# Altium footprint library StandardCase.PcbLib: 200 footprints (part 11 of 13)
Each footprint in its own frame and in the unit in brackets; x right, y up, seen from the top. Pads: shape width x height; smd on the part's side, far side on the other; paste and mask are expansions set on the pad; w line width, h text height; cw(c..) or ccw(c..) is an arc to the next point about the centre after c.
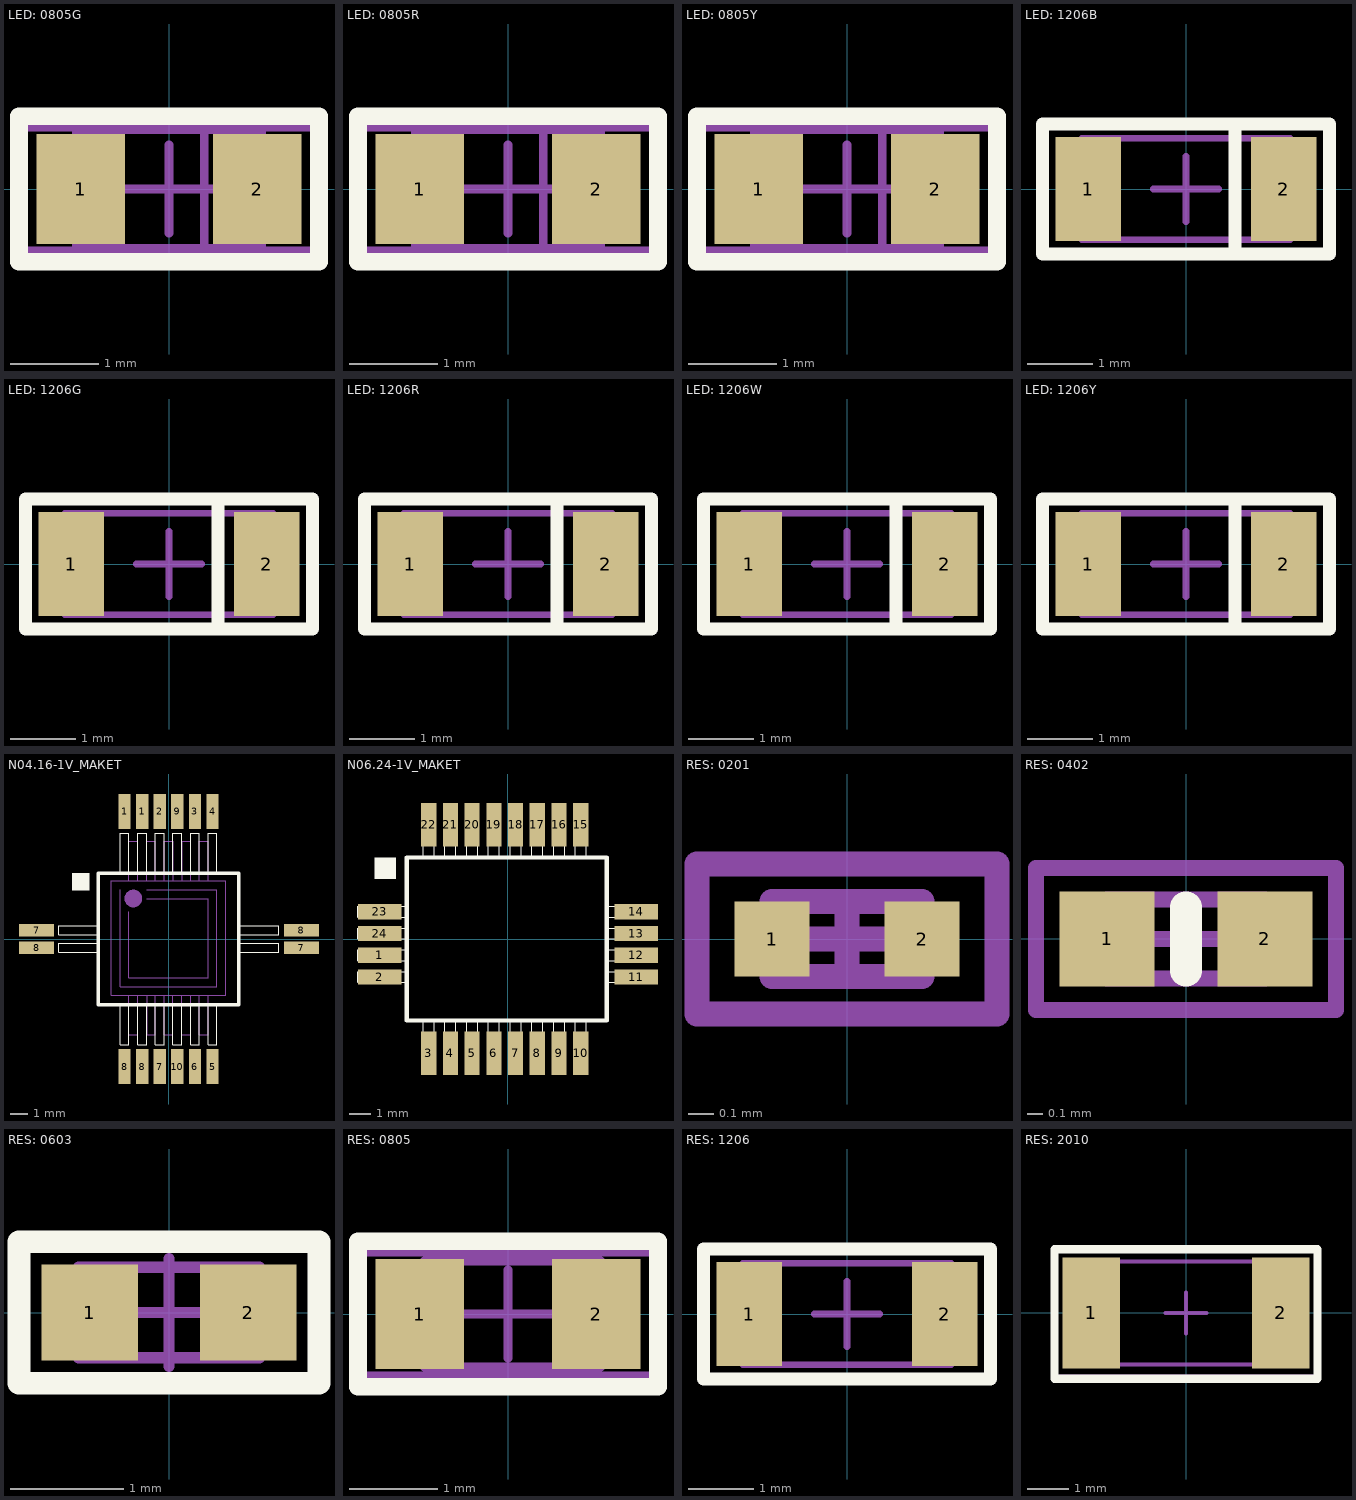
[diagram p10: the footprints below, top view; thin cyan lines are the x and y axes]

## LED: 0805G [mm]
height 1
pads (2):
  rect 1x1.25 smd: 1(-1,0) 2(1,0)
Top Overlay:
  lines w0.2: -1.7,-0.825 1.7,-0.825 1.7,0.825 -1.7,0.825 -1.7,-0.825
Top Assy:
  lines w0.1: 0.4,-0.675 0.4,0.675 ; -1.05,-0.675 1.05,-0.675 1.05,0.675 -1.05,0.675 -1.05,-0.675
Border:
  lines w0.1: -0.5,0 0.5,0 ; 0,-0.5 0,0.5 ; -1.7,-0.7 -1.7,0.7 1.7,0.7 1.7,-0.7 -1.7,-0.7
3D body "LED 0805 - GREEN.STEP": height 0.9, standoff -0.01, extent -1.05,-0.675 1.05,0.675

## LED: 0805R [mm]
height 1
pads (2):
  rect 1x1.25 smd: 1(-1,0) 2(1,0)
Top Overlay:
  lines w0.2: -1.7,-0.825 -1.7,0.825 1.7,0.825 1.7,-0.825 -1.7,-0.825
Top Assy:
  lines w0.1: 0.4,-0.675 0.4,0.675 ; -1.05,-0.675 1.05,-0.675 1.05,0.675 -1.05,0.675 -1.05,-0.675
Border:
  lines w0.1: -0.5,0 0.5,0 ; 0,-0.5 0,0.5 ; -1.7,-0.7 1.7,-0.7 1.7,0.7 -1.7,0.7 -1.7,-0.7
3D body "User Library-CHIPLED-0805.STEP": height 0.9, standoff -0.01, extent -1.05,-0.675 1.05,0.675

## LED: 0805Y [mm]
height 1
pads (2):
  rect 1x1.25 smd: 1(-1,0) 2(1,0)
Top Overlay:
  lines w0.2: -1.7,-0.825 1.7,-0.825 1.7,0.825 -1.7,0.825 -1.7,-0.825
Top Assy:
  lines w0.1: 0.4,-0.675 0.4,0.675 ; -1.05,-0.675 -1.05,0.675 1.05,0.675 1.05,-0.675 -1.05,-0.675
Border:
  lines w0.1: -0.5,0 0.5,0 ; 0,-0.5 0,0.5 ; -1.7,-0.7 -1.7,0.7 1.7,0.7 1.7,-0.7 -1.7,-0.7
3D body "orange.STEP": height 0.9, standoff -0.01, extent -1.05,-0.675 1.05,0.675

## LED: 1206B [mm]
height 0.6
pads (2):
  rect 1x1.6 smd: 1(-1.5,0) 2(1.5,0)
Top Overlay:
  lines w0.2: 0.75,-1 0.75,1 ; -2.2,-1 -2.2,1 2.2,1 2.2,-1 -2.2,-1
Top Assy:
  lines w0.1: -1.6,-0.775 -1.6,0.775 1.6,0.775 1.6,-0.775 -1.6,-0.775
Border:
  lines w0.1: -0.5,0 0.5,0 ; 0,-0.5 0,0.5 ; -2.2,-1 2.2,-1 2.2,1 -2.2,1 -2.2,-1
3D body "User Library-FYLS-1206.step": height 1.1, standoff 0, extent -1.6,-0.8 1.6,0.8

## LED: 1206G [mm]
height 0.6
pads (2):
  rect 1x1.6 smd: 1(-1.5,0) 2(1.5,0)
Top Overlay:
  lines w0.2: 0.75,-1 0.75,1 ; -2.2,-1 -2.2,1 2.2,1 2.2,-1 -2.2,-1
Top Assy:
  lines w0.1: -1.6,-0.775 -1.6,0.775 1.6,0.775 1.6,-0.775 -1.6,-0.775
Border:
  lines w0.1: -0.5,0 0.5,0 ; 0,-0.5 0,0.5 ; -2.2,-1 2.2,-1 2.2,1 -2.2,1 -2.2,-1
3D body "User Library-FYLS-1206.step": height 1.1, standoff 0, extent -1.6,-0.8 1.6,0.8

## LED: 1206R [mm]
height 0.6
pads (2):
  rect 1x1.6 smd: 1(-1.5,0) 2(1.5,0)
Top Overlay:
  lines w0.2: 0.75,-1 0.75,1 ; -2.2,-1 -2.2,1 2.2,1 2.2,-1 -2.2,-1
Top Assy:
  lines w0.1: -1.6,-0.775 -1.6,0.775 1.6,0.775 1.6,-0.775 -1.6,-0.775
Border:
  lines w0.1: -0.5,0 0.5,0 ; 0,-0.5 0,0.5 ; -2.2,-1 2.2,-1 2.2,1 -2.2,1 -2.2,-1
3D body "User Library-FYLS-1206.step": height 1.1, standoff 0, extent -1.6,-0.8 1.6,0.8

## LED: 1206W [mm]
height 0.6
pads (2):
  rect 1x1.6 smd: 1(-1.5,0) 2(1.5,0)
Top Overlay:
  lines w0.2: 0.75,-1 0.75,1 ; -2.2,-1 2.2,-1 2.2,1 -2.2,1 -2.2,-1
Top Assy:
  lines w0.1: -1.6,-0.775 1.6,-0.775 1.6,0.775 -1.6,0.775 -1.6,-0.775
Border:
  lines w0.1: -0.5,0 0.5,0 ; 0,-0.5 0,0.5 ; -2.2,-1 -2.2,1 2.2,1 2.2,-1 -2.2,-1
3D body "User Library-FYLS-1206.step": height 1.1, standoff 0, extent -1.6,-0.8 1.6,0.8

## LED: 1206Y [mm]
height 0.6
pads (2):
  rect 1x1.6 smd: 1(-1.5,0) 2(1.5,0)
Top Overlay:
  lines w0.2: 0.75,-1 0.75,1 ; -2.2,-1 2.2,-1 2.2,1 -2.2,1 -2.2,-1
Top Assy:
  lines w0.1: -1.6,-0.775 1.6,-0.775 1.6,0.775 -1.6,0.775 -1.6,-0.775
Border:
  lines w0.1: -0.5,0 0.5,0 ; 0,-0.5 0,0.5 ; -2.2,-1 -2.2,1 2.2,1 2.2,-1 -2.2,-1
3D body "User Library-FYLS-1206.step": height 1.1, standoff 0, extent -1.6,-0.8 1.6,0.8

## N04.16-1V_МАКЕТ [mm] "корпус ВП, 16 ног"
pads (16):
  rect 0.7x2 smd mask+0.075: 1(-2.525,7.25) 1(-1.525,7.25) 2(-0.525,7.25) 3(1.475,7.25) 4(2.475,7.25) 5(2.475,-7.25) 6(1.475,-7.25) 7(-0.525,-7.25) 8(-2.525,-7.25) 8(-1.525,-7.25) 9(0.475,7.25) 10(0.475,-7.25)
  rect 2x0.7 smd mask+0.075: 7(-7.525,0.5) 7(7.525,-0.5) 8(-7.525,-0.5) 8(7.525,0.5)
Top Overlay:
  region: -4.525,3.75 -5.525,3.75 -5.525,2.75 -4.525,2.75
  lines w0.025: -4.025,-0.75 -6.275,-0.75 -6.275,-0.25 -4.025,-0.25 ; -4.025,0.25 -6.275,0.25 -6.275,0.75 -4.025,0.75 ; -2.775,-3.75 -2.775,-6 -2.275,-6 -2.275,-3.75 ; -2.775,3.75 -2.775,6 -2.275,6 -2.275,3.75 ; -1.775,-3.75 -1.775,-6 -1.275,-6 -1.275,-3.75 ; -1.775,3.75 -1.775,6 -1.275,6 -1.275,3.75 ; -0.775,-3.75 -0.775,-6 -0.275,-6 -0.275,-3.75 ; -0.775,3.75 -0.775,6 -0.275,6 -0.275,3.75 ; 0.225,-3.75 0.225,-6 0.725,-6 0.725,-3.75 ; 0.225,3.75 0.225,6 0.725,6 0.725,3.75 ; 1.225,-3.75 1.225,-6 1.725,-6 1.725,-3.75 ; 1.225,3.75 1.225,6 1.725,6 1.725,3.75 ; 2.225,-3.75 2.225,-6 2.725,-6 2.725,-3.75 ; 2.225,3.75 2.225,6 2.725,6 2.725,3.75 ; 3.975,-0.75 6.225,-0.75 6.225,-0.25 3.975,-0.25 ; 3.975,0.25 6.225,0.25 6.225,0.75 3.975,0.75
  lines w0.2: -4.025,-3.75 3.975,-3.75 3.975,3.75 -4.025,3.75 -4.025,-3.75
Mechanical 2:
  circle w0.5: c-2.025,2.3 r0.25
  lines w0.01: -3.275,-3.2 -3.275,3.3 3.225,3.3 3.225,-3.2 -3.275,-3.2
  lines w0.025: -2.775,2.8 -2.775,-2.7 2.725,-2.7 2.725,2.8 -1.275,2.8 ; -2.275,-3.2 -2.275,-5.45 -1.775,-5.45 -1.775,-3.2 ; -2.275,1.55 -2.275,-2.2 2.225,-2.2 2.225,2.3 -1.275,2.3 ; -2.275,3.3 -2.275,5.55 -1.775,5.55 -1.775,3.3 ; -1.275,-3.2 -1.275,-5.45 -0.775,-5.45 -0.775,-3.2 ; -1.275,3.3 -1.275,5.55 -0.775,5.55 -0.775,3.3 ; -0.275,-3.2 -0.275,-5.45 0.225,-5.45 0.225,-3.2 ; -0.275,3.3 -0.275,5.55 0.225,5.55 0.225,3.3 ; 0.725,-3.2 0.725,-5.45 1.225,-5.45 1.225,-3.2 ; 0.725,3.3 0.725,5.55 1.225,5.55 1.225,3.3 ; 1.725,-3.2 1.725,-5.45 2.225,-5.45 2.225,-3.2 ; 1.725,3.3 1.725,5.55 2.225,5.55 2.225,3.3
3D body "Н04.16-1В.STEP": height 2.92, standoff 0, extent -8,-7.84 8,7.84

## N06.24-1V_МАКЕТ [mm] "корпус ВП, 24 ноги; МАКЕТ"
pads (24):
  rect 2x0.7 smd mask+0.075: 1(-5.9,-0.75) 2(-5.9,-1.75) 11(5.9,-1.75) 12(5.9,-0.75) 13(5.9,0.25) 14(5.9,1.25) 23(-5.9,1.25) 24(-5.9,0.25)
  rect 0.7x2 smd mask+0.075: 3(-3.65,-5.25) 4(-2.65,-5.25) 5(-1.65,-5.25) 6(-0.65,-5.25) 7(0.35,-5.25) 8(1.35,-5.25) 9(2.35,-5.25) 10(3.35,-5.25) 15(3.35,5.25) 16(2.35,5.25) 17(1.35,5.25) 18(0.35,5.25) 19(-0.65,5.25) 20(-1.65,5.25) 21(-2.65,5.25) 22(-3.65,5.25)
Top Overlay:
  region: -5.15,3.75 -6.15,3.75 -6.15,2.75 -5.15,2.75
  lines w0.025: -4.65,-2 -6.9,-2 -6.9,-1.5 -4.65,-1.5 ; -4.65,-1 -6.9,-1 -6.9,-0.5 -4.65,-0.5 ; -4.65,0 -6.9,0 -6.9,0.5 -4.65,0.5 ; -4.65,1 -6.9,1 -6.9,1.5 -4.65,1.5 ; -3.9,-3.75 -3.9,-6 -3.4,-6 -3.4,-3.75 ; -3.9,3.75 -3.9,6 -3.4,6 -3.4,3.75 ; -2.9,-3.75 -2.9,-6 -2.4,-6 -2.4,-3.75 ; -2.9,3.75 -2.9,6 -2.4,6 -2.4,3.75 ; -1.9,-3.75 -1.9,-6 -1.4,-6 -1.4,-3.75 ; -1.9,3.75 -1.9,6 -1.4,6 -1.4,3.75 ; -0.9,-3.75 -0.9,-6 -0.4,-6 -0.4,-3.75 ; -0.9,3.75 -0.9,6 -0.4,6 -0.4,3.75 ; 0.1,-3.75 0.1,-6 0.6,-6 0.6,-3.75 ; 0.1,3.75 0.1,6 0.6,6 0.6,3.75 ; 1.1,-3.75 1.1,-6 1.6,-6 1.6,-3.75 ; 1.1,3.75 1.1,6 1.6,6 1.6,3.75 ; 2.1,-3.75 2.1,-6 2.6,-6 2.6,-3.75 ; 2.1,3.75 2.1,6 2.6,6 2.6,3.75 ; 3.1,-3.75 3.1,-6 3.6,-6 3.6,-3.75 ; 3.1,3.75 3.1,6 3.6,6 3.6,3.75 ; 4.6,-2 6.85,-2 6.85,-1.5 4.6,-1.5 ; 4.6,-1 6.85,-1 6.85,-0.5 4.6,-0.5 ; 4.6,0 6.85,0 6.85,0.5 4.6,0.5 ; 4.6,1 6.85,1 6.85,1.5 4.6,1.5
  lines w0.2: -4.65,-3.75 -4.65,3.75 4.55,3.75 4.55,-3.75 -4.65,-3.75
3D body "H06.24-1B(2мм).stp": height 2.8, standoff -0.2, extent -6.7,-6 6.5,5.6

## RES: 0201 [mm]
height 0.23
pads (2):
  rect 0.3x0.3 smd: 1(-0.3,0) 2(0.3,0)
Top Assy:
  lines w0.1: -0.3,-0.15 -0.3,0.15 0.3,0.15 0.3,-0.15 -0.3,-0.15
Border:
  lines w0.1: -0.15,0 0.15,0 ; 0,-0.15 0,0.15 ; -0.6,-0.3 -0.6,0.3 0.6,0.3 0.6,-0.3 -0.6,-0.3
3D body "chip_0201_r.STEP": height 0.22, standoff -0.02, extent -0.3,-0.15 0.3,0.15

## RES: 0402 [mm]
height 0.35
pads (2):
  rect 0.6x0.6 smd: 1(-0.5,0) 2(0.5,0)
Top Overlay:
  lines w0.2: 0,-0.2 0,0.2
Top Assy:
  lines w0.1: -0.5,-0.25 0.5,-0.25 0.5,0.25 -0.5,0.25 -0.5,-0.25
Border:
  lines w0.1: -0.25,0 0.25,0 ; 0,-0.25 0,0.25 ; -0.95,-0.45 0.95,-0.45 0.95,0.45 -0.95,0.45 -0.95,-0.45
3D body "chip_0402_r.STEP": height 0.34, standoff -0.02, extent -0.525,-0.25 0.475,0.25

## RES: 0603 [mm]
height 0.45
pads (2):
  rect 0.85x0.85 smd: 1(-0.7,0) 2(0.7,0)
Top Overlay:
  lines w0.2: -1.325,-0.625 -1.325,0.625 1.325,0.625 1.325,-0.625 -1.325,-0.625
Top Assy:
  lines w0.1: -0.8,-0.4 -0.8,0.4 0.8,0.4 0.8,-0.4 -0.8,-0.4
Border:
  lines w0.1: -0.475,0 0.475,0 ; 0,-0.475 0,0.475 ; -1.325,-0.65 1.325,-0.65 1.325,0.625 -1.325,0.625 -1.325,-0.65
3D body "chip_0603_r.STEP": height 0.44, standoff -0.02, extent -0.8,-0.4 0.8,0.4

## RES: 0805 [mm]
height 0.45
pads (2):
  rect 1x1.25 smd: 1(-1,0) 2(1,0)
Top Overlay:
  lines w0.2: -1.7,-0.825 1.7,-0.825 1.7,0.825 -1.7,0.825 -1.7,-0.825
Top Assy:
  lines w0.1: -0.949,-0.6 1.05,-0.6 1.05,0.6 -0.949,0.6 -0.949,-0.6
Border:
  lines w0.1: -0.5,0 0.5,0 ; 0,-0.5 0,0.5 ; -1.675,-0.7 -1.675,0.7 1.675,0.7 1.675,-0.7 -1.675,-0.7
3D body "chip_0805_r.STEP": height 0.44, standoff -0.02, extent -1,-0.6 1,0.6

## RES: 1206 [mm]
height 0.6
pads (2):
  rect 1x1.6 smd: 1(-1.5,0) 2(1.5,0)
Top Overlay:
  lines w0.2: -2.2,-1 -2.2,1 2.2,1 2.2,-1 -2.2,-1
Top Assy:
  lines w0.1: -1.6,-0.775 -1.6,0.775 1.6,0.775 1.6,-0.775 -1.6,-0.775
Border:
  lines w0.1: -0.5,0 0.5,0 ; 0,-0.5 0,0.5 ; -2.2,-1 2.2,-1 2.2,1 -2.2,1 -2.2,-1
3D body "chip_1206_r.STEP": height 0.47, standoff -0.03, extent -1.65,-0.8 1.55,0.8

## RES: 2010 [mm]
height 0.55
pads (2):
  rect 1.4x2.7 smd: 1(-2.3,0) 2(2.3,0)
Top Overlay:
  lines w0.2: -3.2,-1.6 3.2,-1.6 3.2,1.55 -3.2,1.55 -3.2,-1.6
Top Assy:
  lines w0.1: -2.5,-1.25 2.5,-1.25 2.5,1.25 -2.5,1.25 -2.5,-1.25
Border:
  lines w0.1: -0.5,0 0.5,0 ; 0,-0.5 0,0.5 ; -3.2,-1.55 3.2,-1.55 3.2,1.55 -3.2,1.55 -3.2,-1.55
3D body "User Library-R_2010.STEP": height 0.6, standoff 0, extent -2.5,-1.25 2.5,1.25